# Altium schematic symbol library SCHLIB.SchLib: 2608 symbols (part 10 of 20)
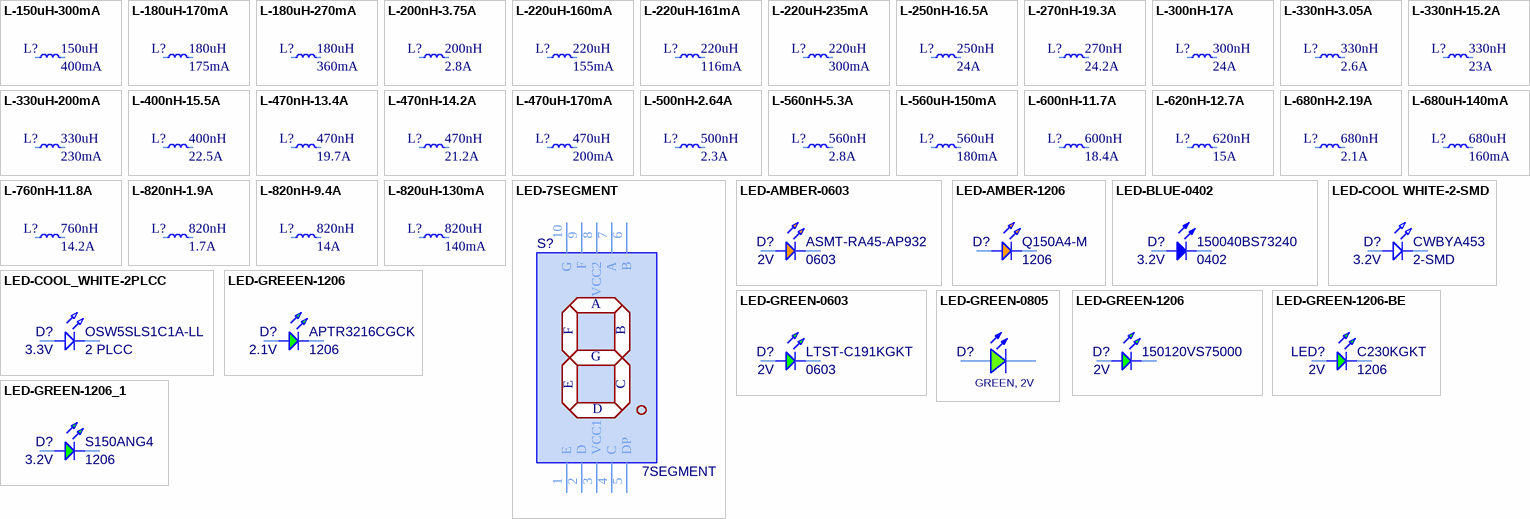
[diagram p92: symbols L-150uH-300mA to LED-GREEN-1206_1]

## L-820nH-1.9A
designator L?  Inductance: 820nH  Current Rating (Amps): 1.7A
FIXED IND 820NH 1.7A 75MOHM SMD; Manufacturer Part Number: XPL2010-821MLC; Manufacturer: COILCRAFT; Tolerance: ±20%; Isat: 1.9A; Shielding: Shielded; Frequency - Self Resonant: 132MHz; Inductance Frequency - Test: 1MHz; Object Type: Part; Design Item ID: L-820nH-1.9A; Series: XPL2010; Material - Core: -; DCR: 75mOhm; Q @ Freq: -; Ratings: AEC-Q200; Operating Temperature: -40°C~125°C; Features: -; Mounting Type: SurfaceMount; Size: 2.00mmx1.90mm; Height: 1.00mm; Category: Inductor
footprint XPL2010
pins: 1, 2

## L-820nH-9.4A
designator L?  Inductance: 820nH  Current Rating (Amps): 14A
FIXED IND 820NH 14A 8.6MOHM SMD; Manufacturer Part Number: XGL4020-821MEC; Manufacturer: COILCRAFT; Tolerance: ±20%; Isat: 9.4A; Shielding: Shielded; Frequency - Self Resonant: 65MHz; Inductance Frequency - Test: 1MHz; Object Type: Part; Design Item ID: L-820nH-9.4A; Series: XGL4020; Material - Core: -; DCR: 8.6mOhm; Q @ Freq: -; Ratings: AEC-Q200; Operating Temperature: -40°C~125°C; Features: -; Mounting Type: SurfaceMount; Size: 4.00mmx4.00mm; Height: 2.10mm; Category: Inductor
footprint XGL4020
pins: 1, 2

## L-820uH-130mA
designator L?  Inductance: 820uH  Current Rating (Amps): 140mA
FIXED IND 820UH 140MA 14 OHM SMD; Manufacturer Part Number: LPS4018-824MRC; Manufacturer: COILCRAFT; Material - Core: Ferrite; Tolerance: ±20%; Isat: 130mA; Shielding: Shielded; DCR: 14Ohm; Frequency - Self Resonant: 2.9MHz; Inductance Frequency - Test: 100kHz; Object Type: Part; Design Item ID: L-820uH-130mA; Series: LPS4018; Q @ Freq: -; Ratings: AEC-Q200; Operating Temperature: -40°C~125°C; Features: -; Mounting Type: SurfaceMount; Size: 3.90mmx3.90mm; Height: 1.80mm; Category: Inductor
footprint LPS4018
pins: 1, 2

## LED-7SEGMENT
designator S?, comment 7SEGMENT
DISPLAY 7SEG 10MM SUPER RED C.A.; Manufacturer: Vishay Semiconductors; Manufacturer Part Number: VDMR10A1; Number of Characters: 1; Max Power Dissipation: 70mW; Luminous Intensity: 1.6mcd; Forward Voltage: 2V; Wavelength: 631nm; Element Configuration: Common Anode; Forward Current: 20mA; Washability: OK; Supplier 1: Digi-Key; Stock 1: 737; Pricing 1: 1=2.2, 10=1.951, 25=1.4472, 100=1.2584, 250=1.13256 (USD); Case/Package: SMD/SMT; Number of Pins: 10; Color: Red; Min Operating Temperature: -35°C; Max Operating Temperature: 105°C; Package Quantity: 1; Packaging: Tape and Reel; Viewing Area (height): 10mm; Illumination Color: Red; Power Consumption: 70mW; Test Current: 20mA; Dominant Wavelength: 631nm; Height: 0.512inch; Width: 0.386inch; Radiation Hardening: No; REACH SVHC: Unknown; Lead Free: Lead Free; ComponentLink1URL: http://www.farnell.com/datasheets/1913357.pdf; ComponentLink1Description: http://www.farnell.com/datasheets/1913357.pdf; ComponentLink2URL: http://www.mouser.com/ds/2/427/vdmx10x0-272413.pdf; ComponentLink2Description: http://www.mouser.com/ds/2/427/vdmx10x0-272413.pdf; ComponentLink3URL: http://www.vishay.com/docs/84197/vdmx10a1.pdf; ComponentLink3Description: http://www.vishay.com/docs/84197/vdmx10a1.pdf; Supplier Part Number 1: VDMR10A1DKR-ND
footprint LED-7SEGMENT-RM-V2
pins: 1 E, 2 D, 3 VCC1, 4 C, 5 DP, 6 B, 7 A, 8 VCC2, 9 F, 10 G

## LED-AMBER-0603
designator D?, comment ASMT-RA45-AP932  Forward Voltage: 2V  Case Code (Imperial): 0603
LED AMBER DIFFUSED SMD 0603; Manufacturer: Broadcom Avago; Color: Orange; Lens Color: Clear,White; Forward Current: 20mA; Luminous Intensity: 90mcd; Viewing Angle: 145°; Wavelength: 591nm; Lens Style: Colorless,Diffused,Rectangular; Number of LEDs: 1; Max Power Dissipation: 48mW; Reverse Voltage: 5V; Washability: OK; Supplier 1: Digi-Key; Manufacturer Part Number: ASMT-RA45-AP932; Stock 1: 0; Mount: Surface Mount; Case/Package: 0603; Number of Pins: 2; Case Code (Metric): 1608; Min Operating Temperature: -40°C; Max Operating Temperature: 100°C; Packaging: Tape and Reel; Test Current: 20mA; Dominant Wavelength: 591nm; Lens Transparency: Diffused; Package Quantity: 4000; Illumination Color: Orange; Power Rating: 48mW; Number of Elements: 1; Power Dissipation: 48mW; Length: 1.6mm; Height: 0.45mm; Width: 0.8mm; Depth: 0.8mm; Radiation Hardening: No; REACH SVHC: No SVHC; ComponentLink1URL: http://www.avagotech.com/docs/AV02-0378EN; ComponentLink1Description: http://www.avagotech.com/docs/AV02-0378EN; ComponentLink2URL: https://www.distrelec.biz/Web/Downloads/_t/ds/ASMT-Rx45_eng_tds.pdf?mime=application%2Fpdf; ComponentLink2Description: https://www.distrelec.biz/Web/Downloads/_t/ds/ASMT-Rx45_eng_tds.pdf?mime=application%2Fpdf; Supplier Part Number 1: ASMT-RA45-AP932-ND
footprint LED-0603-AMBER
pins: A, C

## LED-AMBER-1206
designator D?, comment Q150A4-M  Package/Case: 1206
LED AMBER CLEAR 1206 SMD; Manufacturer: Inolux; Washability: OK; Supplier Part Number 1: 1830-1091-6-ND; Manufacturer Part Number: Q150A4-M; Stock 1: 6455; Pricing 1: 1=0.37, 10=0.272, 25=0.2004, 100=0.143, 250=0.09724, 500=0.0858, 1000=0.06721 (USD); Supplier 1: Megasan
footprint LED-1206-ORANGE
pins: A, C

## LED-BLUE-0402
designator D?, comment 0402  Forward Voltage: 3.2V  Manufacturer Part Number: 150040BS73240
LED BLUE CLEAR 0402 SMD; Manufacturer: Wurth Electronics; Lens Colour: Colorless; Forward Current: 20mA; Luminous Intensity: 60mcd; Viewing Angle: 120°; Dominant Wavelength: 470nm; Lens Style: Clear,Colorless,Diffused,Rectangular; Number of Elements: 1; Reverse Voltage: 5V; Power Rating: 110mW; Washability: OK; Supplier 1: Digi-Key; Stock 1: 5366; Pricing 1: 1=0.29, 10=0.249, 100=0.224, 500=0.199, 1000=0.174 (USD); Supplier Part Number 1: 732-11989-6-ND; Supplier 2: Digi-Key; Supplier Part Number 2: 754-1102-6-ND; Stock 2: 0; Mount: Surface Mount; Case/Package: 0402; Colour: Blue; Case Code (Metric): 1005; Case Code (Imperial): 0402; Min Operating Temperature: -40°C; Max Operating Temperature: 85°C; Package Quantity: 1; Illumination Colour: Blue; Packaging: Tape and Reel; Lens Transparency: Clear; Test Current: 20mA; Wavelength: 470nm; Length: 1mm; Height: 0.6mm; Width: 0.5mm; ComponentLink1URL: http://www.mouser.com/ds/2/216/aphhs1005pbc-a-291456.pdf; ComponentLink1Description: http://www.mouser.com/ds/2/216/aphhs1005pbc-a-291456.pdf; ComponentLink2URL: http://www.kingbrightusa.com/images/catalog/SPEC/APHHS1005PBC-A.pdf; ComponentLink2Description: http://www.kingbrightusa.com/images/catalog/SPEC/APHHS1005PBC-A.pdf; Supplier 3: Digi-Key; Supplier Part Number 3: VAOL-S4SB4DKR-ND; Stock 3: 4313; Pricing 3: 1=0.62, 10=0.485, 25=0.402, 100=0.3465, 250=0.30492, 500=0.26334 (USD); Number of Pins: 2; Number of LEDs: 1; Power Dissipation: 110mW; Depth: 0.5mm; REACH SVHC: Unknown; Lead Free: Lead Free; ComponentLink3URL: http://www.mouser.com/ds/2/423/VAOL-S4SB4-1064984.pdf; ComponentLink3Description: http://www.mouser.com/ds/2/423/VAOL-S4SB4-1064984.pdf; ComponentLink4URL: http://vcclite.com/_pdf/VAOL-S4SB4-LED-0402-blue.pdf; ComponentLink4Description: http://vcclite.com/_pdf/VAOL-S4SB4-LED-0402-blue.pdf; COLOR: BLUE
footprint LED-0402-BLUE
pins: A, C

## LED-COOL WHITE-2-SMD
designator D?, comment CWBYA453  Forward Voltage: 3.2V  Package / Case: 2-SMD
LED COOL WHITE DIFF 2PLCC SMD; Manufacturer: Cree; Manufacturer Part Number: CLM3C-WKW-CWBYA453; Lens Colour: Yellow; Viewing Angle: 120°; Lens Style: Diffused,Elliptical,Flat,Rectangular; Forward Current: 20mA; Luminous Intensity: 1850mcd; Lens Transparency: Diffused; Luminous Flux: 4.2lm; Number of Elements: 1; Power Dissipation: 100mW; Correlated Colour Temperature (CCT): 5500K; Reverse Voltage: 5V; Material: Ceramic; Capacitance: 10nF; Tolerance: 10%; Dielectric: X7R; Voltage Rating (DC): 50V; Voltage: 25V; Washability: OK; Supplier 1: Digi-Key; Supplier Part Number 1: CLM3C-WKW-CWBYA453DKR-ND; Stock 1: 320775; Pricing 1: 1=0.21, 10=0.197, 100=0.1824, 1000=0.16316 (USD); Mount: Surface Mount; Case/Package: SMD/SMT; Number of Pins: 2; Colour: White; Min Operating Temperature: -40°C; Max Operating Temperature: 100°C; Packaging: Tape and Reel; Package Quantity: 1; Illumination Colour: White; Test Current: 20mA; Number of LEDs: 1; Length: 2.7mm; Height: 1.4mm; Width: 2mm; Depth: 2mm; Radiation Hardening: No; REACH SVHC: Unknown; ComponentLink1URL: http://www.farnell.com/datasheets/2047854.pdf; ComponentLink1Description: http://www.farnell.com/datasheets/2047854.pdf; ComponentLink2URL: http://www.cree.com/led-components/media/documents/CLM3C-1076.pdf; ComponentLink2Description: http://www.cree.com/led-components/media/documents/CLM3C-1076.pdf; ComponentLink3URL: https://www.verical.com/server-webapp/html/getDatasheet?partID=351108; ComponentLink3Description: https://www.verical.com/server-webapp/html/getDatasheet?partID=351108; RoHS: Yes; Case Code (Metric): 1005; Case Code (Imperial): 0402; Voltage Rating: 50V; Termination: SMD/SMT; Thickness: 0.022inch; Lead Free: Lead Free; ComponentLink4URL: https://datasheet.ciiva.com/129/product-129810.pdf?src-supplier=Digi-Key; ComponentLink4Description: https://datasheet.ciiva.com/129/product-129810.pdf?src-supplier=Digi-Key; ComponentLink5URL: https://datasheet.ciiva.com/19476/1856433-19476546.pdf?src-supplier=Jameco; ComponentLink5Description: https://datasheet.ciiva.com/19476/1856433-19476546.pdf?src-supplier=Jameco; ComponentLink6URL: https://datasheet.ciiva.com/11786/0900766b80ef921d-11786340.pdf?src-supplier=RSComponents; ComponentLink6Description: https://datasheet.ciiva.com/11786/0900766b80ef921d-11786340.pdf?src-supplier=RSComponents; ComponentLink7URL: https://datasheet.ciiva.com/18100/getdatasheetpartid-27434-18100660.pdf?src-supplier=Verical; ComponentLink7Description: https://datasheet.ciiva.com/18100/getdatasheetpartid-27434-18100660.pdf?src-supplier=Verical; ComponentLink8URL: https://datasheet.ciiva.com/22698/1747449-22698420.pdf?src-supplier=Element14; ComponentLink8Description: https://datasheet.ciiva.com/22698/1747449-22698420.pdf?src-supplier=Element14; ComponentLink9URL: https://datasheet.ciiva.com/29199/454225-da-01-en-vs-kondensator-0402-29199740.pdf?src-supplier=Conrad; ComponentLink9Description: https://datasheet.ciiva.com/29199/454225-da-01-en-vs-kondensator-0402-29199740.pdf?src-supplier=Conrad; ComponentLink10URL: https://datasheet.ciiva.com/129/grm155r71h103ka88-01-129811.pdf?src-supplier=Digi-Key; ComponentLink10Description: https://datasheet.ciiva.com/129/grm155r71h103ka88-01-129811.pdf?src-supplier=Digi-Key; ComponentLink11URL: https://datasheet.ciiva.com/129/grm155r71h103ka88-01-129812.pdf?src-supplier=Digi-Key; ComponentLink11Description: https://datasheet.ciiva.com/129/grm155r71h103ka88-01-129812.pdf?src-supplier=Digi-Key; ComponentLink12URL: https://datasheet.ciiva.com/16495/product-16495290.pdf?src-supplier=Future+Electronics; ComponentLink12Description: https://datasheet.ciiva.com/16495/product-16495290.pdf?src-supplier=Future+Electronics; ComponentLink13URL: https://datasheet.ciiva.com/5410/product-5410990.pdf?src-supplier=Mouser; ComponentLink13Description: https://datasheet.ciiva.com/5410/product-5410990.pdf?src-supplier=Mouser
footprint LED-2PLCC-CLM3C-WKW/WKW
pins: A, C

## LED-COOL_WHITE-2PLCC
designator D?, comment OSW5SLS1C1A-LL  Forward Voltage: 3.3V  Case/Package: 2 PLCC
LED WHITE 2PLCC SMD; Manufacturer: OptoSupply; Lens Colour: Yellow; Forward Current: 20mA; Power Rating: 120mW; Luminous Intensity: 1400mcd; Viewing Angle: 120°; Washability: OK; Max Power Dissipation: 125mW; Temperature Coefficient: 100ppm/°C; Resistance: 750R; Tolerance: 1%; Lens Color: Colorless; Lens Transparency: Clear; Lens Style: Round; Supplier 1: Digi-Key; Supplier Part Number 1: 160-2044-6-ND; Manufacturer Part Number: OSW5SLS1C1A-LL; Stock 1: 97202; Pricing 1: 1=0.6, 10=0.431, 25=0.352, 100=0.2816, 250=0.2376, 500=0.2024, 1000=0.1584 (USD); Mount: Surface Mount; Number of Pins: 2; Colour: White; Min Operating Temperature: -30°C; Max Operating Temperature: 85°C; Illumination Colour: White; Packaging: Tape and Reel; Package Quantity: 2000; Test Current: 20mA; Length: 3.2mm; Height: 1.90mm; Width: 2.8mm; Lead Free: Lead Free; ComponentLink1URL: http://www.mouser.com/ds/2/239/S_110_LTW-670DS-463908.pdf; ComponentLink1Description: http://www.mouser.com/ds/2/239/S_110_LTW-670DS-463908.pdf; ComponentLink2URL: https://media.digikey.com/pdf/Data%20Sheets/Lite-On%20PDFs/LTW-670DS-EL.PDF; ComponentLink2Description: https://media.digikey.com/pdf/Data%20Sheets/Lite-On%20PDFs/LTW-670DS-EL.PDF; ComponentLink3URL: //media.digikey.com/pdf/Data%20Sheets/Lite-On%20PDFs/LTW-670DS-EL.PDF; ComponentLink3Description: //media.digikey.com/pdf/Data%20Sheets/Lite-On%20PDFs/LTW-670DS-EL.PDF; Stock: 10855; Pricing: 1=0.1, 10=0.064, 100=0.026, 1000=0.0117, 2500=0.0101 (USD); RoHS: Yes; Case Code (Imperial): 0603; Case Code (Metric): 1608; Composition: Thin Film; Number of Terminations: 2; Features: Moisture Resistant,Anti-Sulfur; ComponentLink4URL: http://www.seielect.com/Catalog/SEI-rncp.pdf?src-supplier=Digi-Key; ComponentLink4Description: http://www.seielect.com/Catalog/SEI-rncp.pdf?src-supplier=Digi-Key; ComponentLink5URL: https://www.seielect.com/catalog/SEI-Packaging.pdf?src-supplier=Digi-Key; ComponentLink5Description: https://www.seielect.com/catalog/SEI-Packaging.pdf?src-supplier=Digi-Key; Color: White; REACH SVHC: Unknown; ComponentLink6URL: http://www.mouser.com/ds/2/90/C503B-WAN-876-1064327.pdf?src-supplier=Mouser; ComponentLink6Description: http://www.mouser.com/ds/2/90/C503B-WAN-876-1064327.pdf?src-supplier=Mouser; ComponentLink7URL: http://www.cree.com/led-components/media/documents/C503B-WAN-876.pdf?src-supplier=Digi-Key; ComponentLink7Description: http://www.cree.com/led-components/media/documents/C503B-WAN-876.pdf?src-supplier=Digi-Key; ComponentLink8URL: http://www.farnell.com/datasheets/2056200.pdf?src-supplier=Element14; ComponentLink8Description: http://www.farnell.com/datasheets/2056200.pdf?src-supplier=Element14
footprint LED-2PLCC
pins: A, C

## LED-GREEEN-1206
designator D?, comment APTR3216CGCK  Forward Voltage: 2.1V  Case Code (Imperial): 1206
LED GREEN CLEAR CHIP SMD; Manufacturer: Kingbright; Luminous Intensity: 40mcd; Viewing Angle: 120°; Lens Style: Clear,Flat; Forward Current: 20mA; Dominant Wavelength: 570nm; Number of LEDs: 1; Washability: OK; Supplier 1: Digi-Key; Supplier Part Number 1: 754-1167-6-ND; Manufacturer Part Number: APTR3216CGCK; Stock 1: 162847; Pricing 1: 1=0.39, 10=0.277, 25=0.2404, 100=0.1848, 250=0.15016, 500=0.11088, 1000=0.0924 (USD); Mount: Surface Mount; Case/Package: 1206; Number of Pins: 2; Colour: Green; Case Code (Metric): 3216; Lens Colour: Clear; Min Operating Temperature: -40°C; Max Operating Temperature: 85°C; Package Quantity: 2000; Packaging: Tape and Reel; Illumination Colour: Green; Test Current: 20mA; Length: 3.2mm; Height: 1.05mm; Width: 1.6mm; Lead Free: Lead Free; ComponentLink1URL: http://www.kingbrightusa.com/images/catalog/SPEC/APTR3216CGCK.pdf; ComponentLink1Description: http://www.kingbrightusa.com/images/catalog/SPEC/APTR3216CGCK.pdf; ComponentLink2URL: http://www.mouser.com/ds/2/216/APTR3216CGCK-77188.pdf; ComponentLink2Description: http://www.mouser.com/ds/2/216/APTR3216CGCK-77188.pdf
footprint LED-1206-GREEN
pins: A, C

## LED-GREEN-0603
designator D?, comment LTST-C191KGKT  Forward Voltage: 2V  Case Code (Imperial): 0603
LED GREEN CLEAR 0603 SMD; Manufacturer: Vishay Lite-On; Lens Colour: Clear,Colorless; Power Rating: 75mW; Luminous Intensity: 35mcd; Viewing Angle: 130°; Lens Style: Clear,Colorless,Diffused,Rectangular; Forward Current: 30mA; Dominant Wavelength: 571nm; Test Current: 20mA; Number of Elements: 1; Wavelength: 574nm; Reverse Voltage: 5V; Washability: OK; Supplier 1: Digi-Key; Supplier Part Number 1: 160-1446-1-ND; Manufacturer Part Number: LTST-C191KGKT; Stock 1: 2123523; Pricing 1: 1=0.29, 10=0.215, 25=0.16, 100=0.1153, 250=0.0798, 500=0.07088, 1000=0.05644, 2500=0.05533 (USD); Mount: Surface Mount; Case/Package: 0603; Number of Pins: 2; Colour: Green; Case Code (Metric): 1608; Min Operating Temperature: -55°C; Max Operating Temperature: 85°C; Packaging: Tape and Reel; Package Quantity: 1; Illumination Colour: Green; Lens Transparency: Clear; Power Dissipation: 75mW; Number of LEDs: 1; Length: 1.6mm; Height: 0.55mm; Width: 0.8mm; Depth: 0.8mm; Radiation Hardening: No; Lead Free: Lead Free; ComponentLink1URL: http://www.mouser.com/ds/2/239/LTST-C191KGKT-1141954.pdf; ComponentLink1Description: http://www.mouser.com/ds/2/239/LTST-C191KGKT-1141954.pdf; ComponentLink2URL: http://optoelectronics.liteon.com/upload/download/DS22-2000-228/LTST-C191KGKT.PDF; ComponentLink2Description: http://optoelectronics.liteon.com/upload/download/DS22-2000-228/LTST-C191KGKT.PDF; ComponentLink3URL: https://www.verical.com/server-webapp/html/getDatasheet?partID=103913; ComponentLink3Description: https://www.verical.com/server-webapp/html/getDatasheet?partID=103913; ComponentLink4URL: http://uk.rs-online.com/webdocs/0dc0/0900766b80dc02b1.pdf; ComponentLink4Description: http://uk.rs-online.com/webdocs/0dc0/0900766b80dc02b1.pdf; ComponentLink5URL: http://www1.futureelectronics.com/doc/LITE-ON/LTST-C191KGKT.pdf; ComponentLink5Description: http://www1.futureelectronics.com/doc/LITE-ON/LTST-C191KGKT.pdf
footprint LED-0603-GREEN
pins: A, C

## LED-GREEN-0805
designator D?, comment GREEN, 2V
LED GREEN CLEAR 0805 SMD; Part Number: 150080VS75000; Viewing Angle: 140deg; Chip Technology: AlInGaP; Dominant Wavelength typ.: 570nm; Emitting Color: Bright Green; Luminous Intensity typ.: 40mcd; Peak Wavelength typ.: 572nm; ComponentLink1Description: Manufacturer; ComponentLink1URL: http://www.we-online.de; ComponentLink2URL: https://www.we-online.com/catalog/datasheet/150080VS75000.pdf; ComponentLink2Description: Datasheet; Forward Voltage typ.: 2V; Mounting Technology: SMT; Operating Temperature: -40 to +85degC; Published Date: December 2019; Packaging: Tape and Reel; Size: 0805; Publisher: Wurth Elektronik
footprint WL-SMCW_0805
pins: 1 K, 2 A

## LED-GREEN-1206
designator D?, comment 150120VS75000  Forward Voltage: 2V
LED GREEN CLEAR 1206 SMD; Manufacturer: Wurth Electronics; Luminous Intensity: 40mcd; Forward Current: 30mA; Viewing Angle: 140°; Lens Style: Clear,Rectangular; Wavelength: 570nm; Test Current: 20mA; Washability: OK; Supplier 1: Mouser; Manufacturer Part Number: 150120VS75000; Stock 1: 3898; Pricing 1: 1=0,21000, 10=0,20400, 25=0,20400, 50=0,19200, 100=0,16500, 250=0,14700 (USD); RoHS: Yes; Mount: Surface Mount; Case/Package: 1206; Color: Green; Case Code (Metric): 3216; Case Code (Imperial): 1206; Min Operating Temperature: -40°C; Max Operating Temperature: 85°C; Package Quantity: 1; Packaging: Tape and Reel; Dominant Wavelength: 570nm; Length: 3.2mm; Height: 0.68mm; Width: 1.6mm; REACH SVHC: Unknown; ComponentLink1URL: https://datasheet.ciiva.com/29561/150120vs75000-29561865.pdf?src-supplier=Digi-Key; ComponentLink1Description: https://datasheet.ciiva.com/29561/150120vs75000-29561865.pdf?src-supplier=Digi-Key; ComponentLink2URL: https://datasheet.ciiva.com/29279/759444-da-01-en-chipled-1206-w-kl-h-gruen-150120vs7500-29279050.pdf?src-supplier=Conrad; ComponentLink2Description: https://datasheet.ciiva.com/29279/759444-da-01-en-chipled-1206-w-kl-h-gruen-150120vs7500-29279050.pdf?src-supplier=Conrad; ComponentLink3URL: https://datasheet.ciiva.com/29561/150120vs75000-29561866.pdf?src-supplier=Digi-Key; ComponentLink3Description: https://datasheet.ciiva.com/29561/150120vs75000-29561866.pdf?src-supplier=Digi-Key; ComponentLink4URL: https://datasheet.ciiva.com/22656/1911467-22656987.pdf?src-supplier=Element14; ComponentLink4Description: https://datasheet.ciiva.com/22656/1911467-22656987.pdf?src-supplier=Element14; ComponentLink5URL: https://datasheet.ciiva.com/29561/150120vs75000-29561867.pdf?src-supplier=Digi-Key; ComponentLink5Description: https://datasheet.ciiva.com/29561/150120vs75000-29561867.pdf?src-supplier=Digi-Key; Supplier Part Number 1: 710-150120VS75000
footprint LED-1206-GREEN
pins: A, C

## LED-GREEN-1206-BE
designator LED?, comment C230KGKT  Forward Voltage: 2V  Case/Package: 1206
LED GREEN CLEAR CHIP SMD; Manufacturer: Vishay Lite-On; Manufacturer Part Number: LTST-C230KGKT; Lens Color: Colorless; Luminous Intensity: 35mcd; Viewing Angle: 130°; Dominant Wavelength: 571nm; Test Current: 20mA; Wavelength: 574nm; Forward Current: 30mA; Power Rating: 75mW; Lens Style: Diffused,Colorless,Clear,Rectangular; Number of Elements: 1; Reverse Voltage: 5V; Supplier 1: Digi-Key; Supplier Part Number 1: 160-1456-1-ND; Stock: 228906; Pricing: 1=0.31, 10=0.226, 100=0.1071, 500=0.0714, 1000=0.0559 (USD); RoHS: Yes; Mount: Surface Mount; Number of Pins: 2; Color: Green; Case Code (Metric): 3216; Case Code (Imperial): 1206; Min Operating Temperature: -55°C; Max Operating Temperature: 85°C; Packaging: Tape and Reel; Package Quantity: 1; Lens Transparency: Clear; Illumination Color: Green; Power Dissipation: 75mW; Number of LEDs: 1; Length: 3.2mm; Height: 1.1mm; Width: 1.6mm; Depth: 1.6mm; Radiation Hardening: No; Lead Free: Lead Free; ComponentLink1URL: https://datasheet.ciiva.com/15118/getdatasheetpartid-214545-15118102.pdf?src-supplier=Verical; ComponentLink1Description: https://datasheet.ciiva.com/15118/getdatasheetpartid-214545-15118102.pdf?src-supplier=Verical; ComponentLink2URL: https://datasheet.ciiva.com/12400/lite-on-ltst-c230kgkt-190174-12400698.pdf?src-supplier=Mouser; ComponentLink2Description: https://datasheet.ciiva.com/12400/lite-on-ltst-c230kgkt-190174-12400698.pdf?src-supplier=Mouser; ComponentLink3URL: https://datasheet.ciiva.com/11773/0900766b80dc057a-11773900.pdf?src-supplier=RSComponents; ComponentLink3Description: https://datasheet.ciiva.com/11773/0900766b80dc057a-11773900.pdf?src-supplier=RSComponents; ComponentLink4URL: https://datasheet.ciiva.com/2110/s-110-ltst-c230kgkt-2110033.pdf?src-supplier=Digi-Key; ComponentLink4Description: https://datasheet.ciiva.com/2110/s-110-ltst-c230kgkt-2110033.pdf?src-supplier=Digi-Key; ComponentLink5URL: https://datasheet.ciiva.com/2110/s-110-ltst-c230kgkt-2110034.pdf?src-supplier=Digi-Key; ComponentLink5Description: https://datasheet.ciiva.com/2110/s-110-ltst-c230kgkt-2110034.pdf?src-supplier=Digi-Key; ComponentLink6URL: https://datasheet.ciiva.com/2110/s-110-ltst-c230kgkt-2110035.pdf?src-supplier=Digi-Key; ComponentLink6Description: https://datasheet.ciiva.com/2110/s-110-ltst-c230kgkt-2110035.pdf?src-supplier=Digi-Key
footprint LED-BE-1206-V1
pins: A, C

## LED-GREEN-1206_1
designator D?, comment S150ANG4  Forward Voltage: 3.2V  Case Code (Imperial): 1206
LED GREEN CLEAR CHIP SMD; Manufacturer: SunLED; Manufacturer Part Number: XZM2DG55W-1; Lens Colour: Colorless; Luminous Intensity: 745mcd; Test Current: 20mA; Viewing Angle: 120°; Dominant Wavelength: 525nm; Washability: OK; Supplier 1: Digi-Key; Supplier Part Number 1: 1497-1163-6-ND; Stock 1: 2936; Pricing 1: 1=1.07, 10=0.831, 25=0.6884, 100=0.5936, 250=0.52232, 500=0.4511, 1000=0.35613 (USD); Mount: Surface Mount; Case/Package: 1206; Colour: Green; Case Code (Metric): 3216; Packaging: Tape and Reel; Lens Transparency: Clear; Length: 3.2mm; Height: 0.75mm; Width: 1.6mm
footprint LED-1206-GREEN
pins: A, C

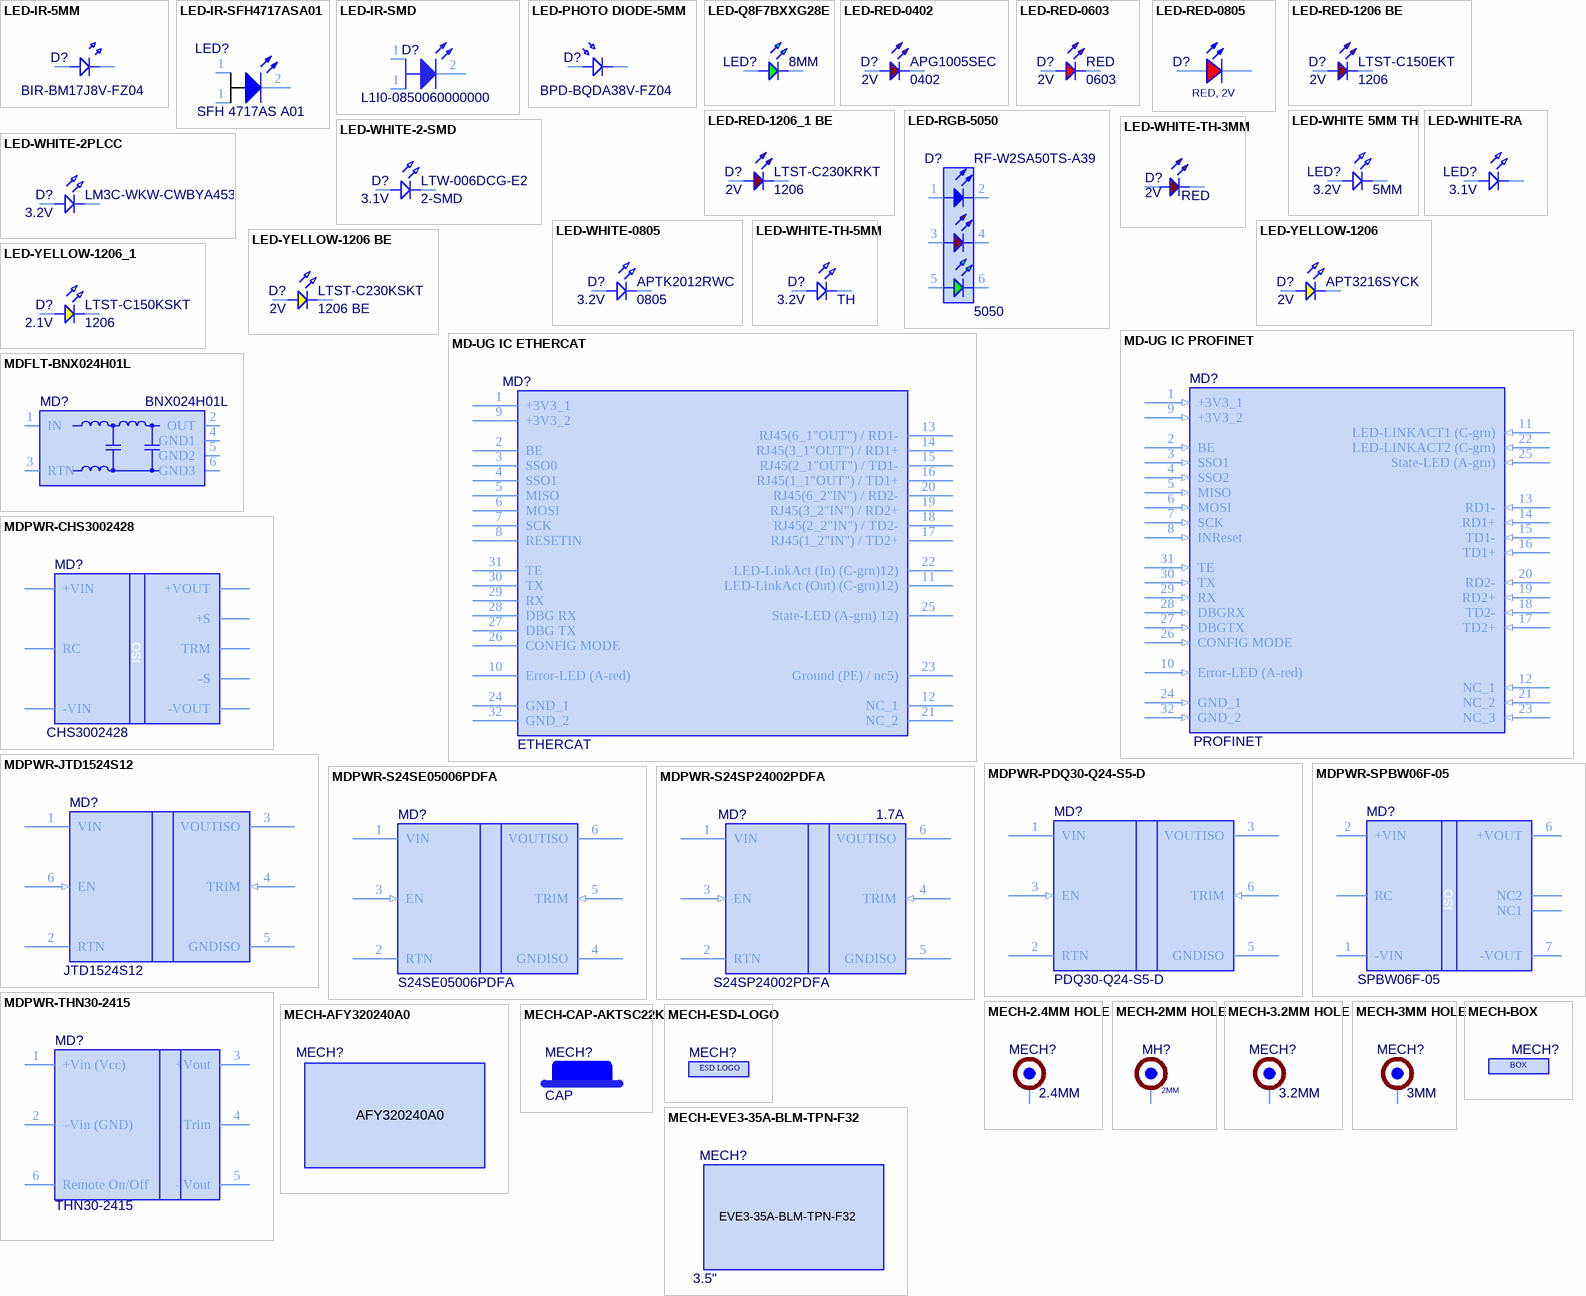
[diagram p41: symbols LED-IR-5MM to MECH-EVE3-35A-BLM-TPN-F32]

## LED-IR-5MM
designator D?, comment BIR-BM17J8V-FZ04
5MM 940 IR; Manufacturer: American Bright; Washability: OK; Supplier 1: Digi-Key; Manufacturer Part Number: BIR-BM17J8V-FZ04; Stock 1: 20000; Pricing 1: 1=0,62000, 10=0,44300, 100=0,28960, 500=0,20818, 1000=0,16292 (USD); RoHS: No; Supplier Part Number 1: BIR-BM17J8V-FZ04CT-ND
footprint LED-2.54MM-TH
pins: A, C

## LED-IR-SFH4717ASA01
designator LED?, comment SFH 4717AS A01
OSLON Black Series (850 nm) - 50°; Manufacturer: Osram Opto; Touchscreen: Infrared (IR); Wavelength: 860nm; Forward Voltage: 3.5V; Supplier 1: Digi-Key; Supplier Part Number 1: 475-3553-6-ND; Manufacturer Part Number: SFH4717ASA01; Stock: 0; RoHS: No; Mount: Surface Mount; Case/Package: 1515; Case Code (Imperial): 1515; Case Code (Metric): 3838; Min Operating Temperature: -40°C; Max Operating Temperature: 125°C; Packaging: Cut Tape; Viewing Angle: 50°; Orientation: Top View; ComponentLink1URL: http://www.farnell.com/datasheets/2711623.pdf?src-supplier=Farnell; ComponentLink1Description: http://www.farnell.com/datasheets/2711623.pdf?src-supplier=Farnell
footprint LED-IR OSRAM (LUXEON IR Domed (90 degree dome in 3D))
pins: 1 A, 1 A, 2 K

## LED-IR-SMD
designator D?, comment L1I0-0850060000000
LED INFRARED SMD; Manufacturer: Philips Lumileds; Touchscreen: Infrared (IR); Wavelength: 850nm; Forward Voltage: 3.2V; Viewing Angle: 60°; Supplier 1: Digi-Key; Supplier Part Number 1: 1416-1991-1-ND; Manufacturer Part Number: L1I0-0850060000000; Stock: 0; Pricing: 1=3.52, 10=2.931, 100=2.0515, 500=1.8317 (USD); RoHS: No; Mount: Surface Mount; Case/Package: SMD/SMT; Min Operating Temperature: -30°C; Max Operating Temperature: 85°C; Packaging: Cut Tape; Orientation: Top View; ComponentLink1URL: http://www.lumileds.com/uploads/684/PB191-pdf?src-supplier=Digi-Key; ComponentLink1Description: http://www.lumileds.com/uploads/684/PB191-pdf?src-supplier=Digi-Key; ComponentLink2URL: https://www.lumileds.com/uploads/685/DS191-pdf?src-supplier=Digi-Key; ComponentLink2Description: https://www.lumileds.com/uploads/685/DS191-pdf?src-supplier=Digi-Key
footprint LED-LUXEON IR Domed (LUXEON IR Domed (90 degree dome in 3D))
pins: 1 A, 1 A, 2 K

## LED-PHOTO DIODE-5MM
designator D?, comment BPD-BQDA38V-FZ04
SENSOR PHOTODIODE RADIAL; Manufacturer: American Bright; Washability: OK; Supplier 1: Digi-Key; Manufacturer Part Number: BPD-BQDA38V-FZ04; Stock 1: 15970; Pricing 1: 1=0,68000, 10=0,53200, 100=0,34130, 500=0,29348 (USD); RoHS: No; Supplier Part Number 1: BPD-BQDA38V-FZ04CT-ND
footprint LED-2.54MM-TH - PD
pins: A, C

## LED-Q8F7BXXG28E
designator LED?, comment 8MM
LED PANEL MOUNT INDICATORS 8MM FLUSH; Manufacturer Part Number: Q8F7BXXG28E
pins: A, C

## LED-RED-0402
designator D?, comment APG1005SEC  Forward Voltage: 2V  Case/Package: 0402
LED RED CLEAR CHIP SMD; Manufacturer: Kingbright; Manufacturer Part Number: APG1005SEC/E-T; Lens Color: Colorless; Luminous Intensity: 75mcd; Test Current: 20mA; Viewing Angle: 120°; Dominant Wavelength: 624nm; Washability: OK; Supplier 1: Digi-Key; Stock 1: 4934; Pricing 1: 1=0.42000, 10=0.30200, 25=0.24640, 100=0.19710, 250=0.16632, 500=0.14168, 1000=0.11088 (USD); RoHS: Yes; Mount: Surface Mount; Color: Red; Case Code (Metric): 1005; Case Code (Imperial): 0402; Package Quantity: 4000; Packaging: Tape and Reel; Lens Transparency: Clear; Length: 1mm; Height: 0.25mm; Width: 0.5mm; Lead Free: Lead Free; ComponentLink1URL: https://datasheet.ciiva.com/29562/apg1005sec-e-t-29562092.pdf?src-supplier=Digi-Key; ComponentLink1Description: https://datasheet.ciiva.com/29562/apg1005sec-e-t-29562092.pdf?src-supplier=Digi-Key; Supplier Part Number 1: 754-1812-1-ND
footprint LED-0402-RED
pins: A, C

## LED-RED-0603
designator D?, comment RED  Case/Package: 0603  Forward Voltage: 2V
LED RED CLEAR 0603 SMD; Manufacturer: Wurth Electronics; Manufacturer Part Number: 150060RS75000; Viewing Angle: 140°; Lens Style: Clear,Rectangular; Luminous Intensity: 250mcd; Forward Current: 30mA; Wavelength: 625nm; Test Current: 20mA; Supplier 1: Digi-Key; Supplier Part Number 1: 732-4978-1-ND; Stock: 110086; Pricing: 1=0.14, 50=0.133, 100=0.114, 500=0.099 (USD); RoHS: Yes; Mount: Surface Mount; Color: Red; Case Code (Metric): 1608; Case Code (Imperial): 0603; Min Operating Temperature: -40°C; Max Operating Temperature: 85°C; Package Quantity: 1; Packaging: Cut Tape; Dominant Wavelength: 625nm; Length: 1.6mm; Height: 0.7mm; Width: 0.8mm; REACH SVHC: Unknown; ComponentLink1URL: https://datasheet.ciiva.com/29563/150060rs75000-29563040.pdf?src-supplier=Digi-Key; ComponentLink1Description: https://datasheet.ciiva.com/29563/150060rs75000-29563040.pdf?src-supplier=Digi-Key; ComponentLink2URL: https://datasheet.ciiva.com/29279/759428-da-01-en-chipled-0603-w-kl-rot-150060rs75000-29279196.pdf?src-supplier=Conrad; ComponentLink2Description: https://datasheet.ciiva.com/29279/759428-da-01-en-chipled-0603-w-kl-rot-150060rs75000-29279196.pdf?src-supplier=Conrad
footprint LED-0603 (Chip LED, 2-Leads, Body 1.6x0.8mm, IPC Medium Density)
pins: A, C

## LED-RED-0805
designator D?, comment RED, 2V
LED RED CLEAR 0805 SMD; Part Number: 150080RS75000; Viewing Angle: 140deg; Chip Technology: AlInGaP; Dominant Wavelength typ.: 625nm; Luminous Intensity typ.: 150mcd; Peak Wavelength typ.: 630nm; ComponentLink1Description: Manufacturer; ComponentLink1URL: http://www.we-online.de; ComponentLink2URL: https://www.we-online.com/catalog/datasheet/150080RS75000.pdf; ComponentLink2Description: Datasheet; Forward Voltage typ.: 2V; Emitting Color: Red; Mounting Technology: SMT; Operating Temperature: -40 to +85degC; Published Date: December 2019; Packaging: Tape and Reel; Size: 0805; Publisher: Wurth Elektronik
footprint WL-SMCW_0805
pins: 1 K, 2 A

## LED-RED-1206 BE
designator D?, comment LTST-C150EKT  Forward Voltage: 2V  Case Code (Imperial): 1206
LED RED CLEAR 1206 SMD; Manufacturer: Vishay Lite-On; Colour: Orange,Red; Lens Colour: Clear,Colorless; Forward Current: 30mA; Luminous Intensity: 6mcd; Viewing Angle: 130°; Lens Style: Clear,Colorless,Diffused,Rectangular; Power Rating: 100mW; Dominant Wavelength: 621nm; Test Current: 10mA; Number of Elements: 1; Wavelength: 630nm; Reverse Voltage: 5V; Washability: OK; Supplier 1: Digi-Key; Supplier Part Number 1: 160-1168-1-ND; Manufacturer Part Number: LTST-C150EKT; Stock 1: 66576; Pricing 1: 1=0.36, 10=0.262, 25=0.1932, 100=0.1381, 250=0.09388, 500=0.08284, 1000=0.06488 (USD); Mount: Surface Mount; Case/Package: 1206; Number of Pins: 2; Case Code (Metric): 3216; Min Operating Temperature: -55°C; Max Operating Temperature: 85°C; Packaging: Tape and Reel; Package Quantity: 1; Illumination Colour: Red; Lens Transparency: Clear; Power Dissipation: 100mW; Number of LEDs: 1; Length: 3.2mm; Height: 1.1mm; Width: 1.6mm; Depth: 1.6mm; Radiation Hardening: No; Lead Free: Lead Free; ComponentLink1URL: https://www.verical.com/server-webapp/html/getDatasheet?partID=214540; ComponentLink1Description: https://www.verical.com/server-webapp/html/getDatasheet?partID=214540; ComponentLink2URL: https://media.digikey.com/pdf/Data%20Sheets/Lite-On%20PDFs/LTST-C150EKT.pdf; ComponentLink2Description: https://media.digikey.com/pdf/Data%20Sheets/Lite-On%20PDFs/LTST-C150EKT.pdf; ComponentLink3URL: http://www1.futureelectronics.com/doc/LITE%20ON/LITE-ON%20LTST-C150EKT.pdf; ComponentLink3Description: http://www1.futureelectronics.com/doc/LITE%20ON/LITE-ON%20LTST-C150EKT.pdf
footprint LED-1206-RED
pins: A, C

## LED-RED-1206_1 BE
designator D?, comment LTST-C230KRKT  Forward Voltage: 2V  Case Code (Imperial): 1206
LED RED CLEAR 1206 SMD; Manufacturer: Vishay Lite-On; Lens Colour: Clear,Colorless; Viewing Angle: 130°; Luminous Intensity: 54mcd; Dominant Wavelength: 631nm; Test Current: 20mA; Wavelength: 639nm; Lens Style: Clear,Colorless,Diffused,Rectangular; Forward Current: 30mA; Power Rating: 75mW; Number of Elements: 1; Reverse Voltage: 5V; Washability: OK; Supplier 1: Digi-Key; Supplier Part Number 1: 160-1457-1-ND; Manufacturer Part Number: LTST-C230KRKT; Stock 1: 231062; Pricing 1: 1=0.34, 10=0.248, 25=0.1824, 100=0.1304, 250=0.08864, 500=0.07822, 1000=0.06126 (USD); Mount: Surface Mount; Case/Package: 1206; Number of Pins: 2; Colour: Red; Case Code (Metric): 3216; Min Operating Temperature: -55°C; Max Operating Temperature: 85°C; Package Quantity: 1; Packaging: Tape and Reel; Lens Transparency: Clear; Illumination Colour: Red; Power Dissipation: 75mW; Number of LEDs: 1; Length: 3.2mm; Height: 1.1mm; Width: 1.6mm; Depth: 1.6mm; Radiation Hardening: No; Lead Free: Lead Free; ComponentLink1URL: https://media.digikey.com/pdf/Data%20Sheets/Lite-On%20PDFs/LTST-C230KRKT.pdf; ComponentLink1Description: https://media.digikey.com/pdf/Data%20Sheets/Lite-On%20PDFs/LTST-C230KRKT.pdf; ComponentLink2URL: http://components.arrow.com/part/dataview/28198027S9041759N1331; ComponentLink2Description: http://components.arrow.com/part/dataview/28198027S9041759N1331; ComponentLink3URL: https://www.verical.com/server-webapp/html/getDatasheet?partID=144017; ComponentLink3Description: https://www.verical.com/server-webapp/html/getDatasheet?partID=144017; ComponentLink4URL: http://www.mouser.com/ds/2/239/Lite-On-LTST-C230KRKT-187437.pdf; ComponentLink4Description: http://www.mouser.com/ds/2/239/Lite-On-LTST-C230KRKT-187437.pdf; ComponentLink5URL: http://www1.futureelectronics.com/doc/LITE-ON/LTST-C230KRKT.pdf; ComponentLink5Description: http://www1.futureelectronics.com/doc/LITE-ON/LTST-C230KRKT.pdf
footprint LED-BE-1206-V1
pins: A, C

## LED-RGB-5050
designator D?, comment RF-W2SA50TS-A39  Package/Case: 5050
LED SMD 5050 RGB; Manufacturer: REFOND; Washability: OK; Manufacturer Part Number: RF-W2SA50TS-A39; Stock 1: 53; Pricing 1: 1=0.58, 10=0.525, 100=0.473, 500=0.368 (USD); Supplier 1: Ozdisan
footprint LED-SMD-5050
pins: 1 A, 2 K, 3 A, 4 K, 5 A, 6 K

## LED-WHITE 5MM TH
designator LED?, comment 5MM  Forward Voltage: 3.2V
LED COOL WHITE CLEAR 5MM T/H; Manufacturer: Cree; Manufacturer Part Number: C503B-WAN-CBBDB231; Lens Color: Colorless; Luminous Intensity: 33125mcd; Test Current: 20mA; Viewing Angle: 15°; Lens Style: Round; Supplier 1: Digi-Key; Supplier Part Number 1: C503B-WAN-CBBDB231-ND; Stock: 14608; Pricing: 1=0.23, 10=0.216, 100=0.1998, 1000=0.1787, 50000=0.1659 (USD); RoHS: Yes; Mount: Through Hole; Case/Package: Radial; Color: White; Packaging: Bulk; Lens Transparency: Clear; Forward Current: 20mA; Height: 10.3mm; REACH SVHC: Unknown; ComponentLink1URL: http://www.mouser.com/ds/2/90/C503B-WAN-876-1064327.pdf?src-supplier=Mouser; ComponentLink1Description: http://www.mouser.com/ds/2/90/C503B-WAN-876-1064327.pdf?src-supplier=Mouser; ComponentLink2URL: http://www.cree.com/led-components/media/documents/C503B-WAN-876.pdf?src-supplier=Digi-Key; ComponentLink2Description: http://www.cree.com/led-components/media/documents/C503B-WAN-876.pdf?src-supplier=Digi-Key; ComponentLink3URL: http://www.farnell.com/datasheets/2056200.pdf?src-supplier=Element14; ComponentLink3Description: http://www.farnell.com/datasheets/2056200.pdf?src-supplier=Element14
footprint CONFLEX2TOP_REV2
pins: 1 A, 2 C

## LED-WHITE-2-SMD
designator D?, comment LTW-006DCG-E2  Forward Voltage: 3.1V  Package / Case: 2-SMD
LED WHITE 2SMD R/A; Manufacturer: Vishay Lite-On; Lens Colour: Yellow; Viewing Angle: 110°; Luminous Intensity: 2100mcd; Forward Current: 30mA; Test Current: 20mA; Number of Elements: 1; Lens Style: Colored; Power Dissipation: 120mW; Reverse Voltage: 5V; Washability: OK; Supplier 1: Digi-Key; Supplier Part Number 1: 160-1870-6-ND; Manufacturer Part Number: LTW-006DCG-E2; Stock 1: 320342; Pricing 1: 1=0.48, 10=0.348, 25=0.284, 100=0.227, 250=0.19156, 500=0.16318, 1000=0.12771 (USD); Mount: Surface Mount; Case/Package: SMD/SMT; Number of Pins: 2; Colour: White; Min Operating Temperature: -30°C; Max Operating Temperature: 85°C; Packaging: Tape and Reel; Package Quantity: 1; Length: 3.8mm; Height: 0.6mm; Width: 1.2mm; Depth: 1.2mm; Lead Free: Lead Free; ComponentLink1URL: https://media.digikey.com/pdf/Data%20Sheets/Lite-On%20PDFs/LTW-006DCG-E2.pdf; ComponentLink1Description: https://media.digikey.com/pdf/Data%20Sheets/Lite-On%20PDFs/LTW-006DCG-E2.pdf
footprint LED-2SMD-RA
pins: A, C

## LED-WHITE-2PLCC
designator D?, comment LM3C-WKW-CWBYA453  Forward Voltage: 3.2V